# Altium footprint library Connectors.PcbLib: 67 footprints (part 2 of 5)
Each footprint in its own frame and in the unit in brackets; x right, y up, seen from the top. Pads: shape width x height; smd on the part's side, far side on the other; paste and mask are expansions set on the pad; w line width, h text height; cw(c..) or ccw(c..) is an arc to the next point about the centre after c.
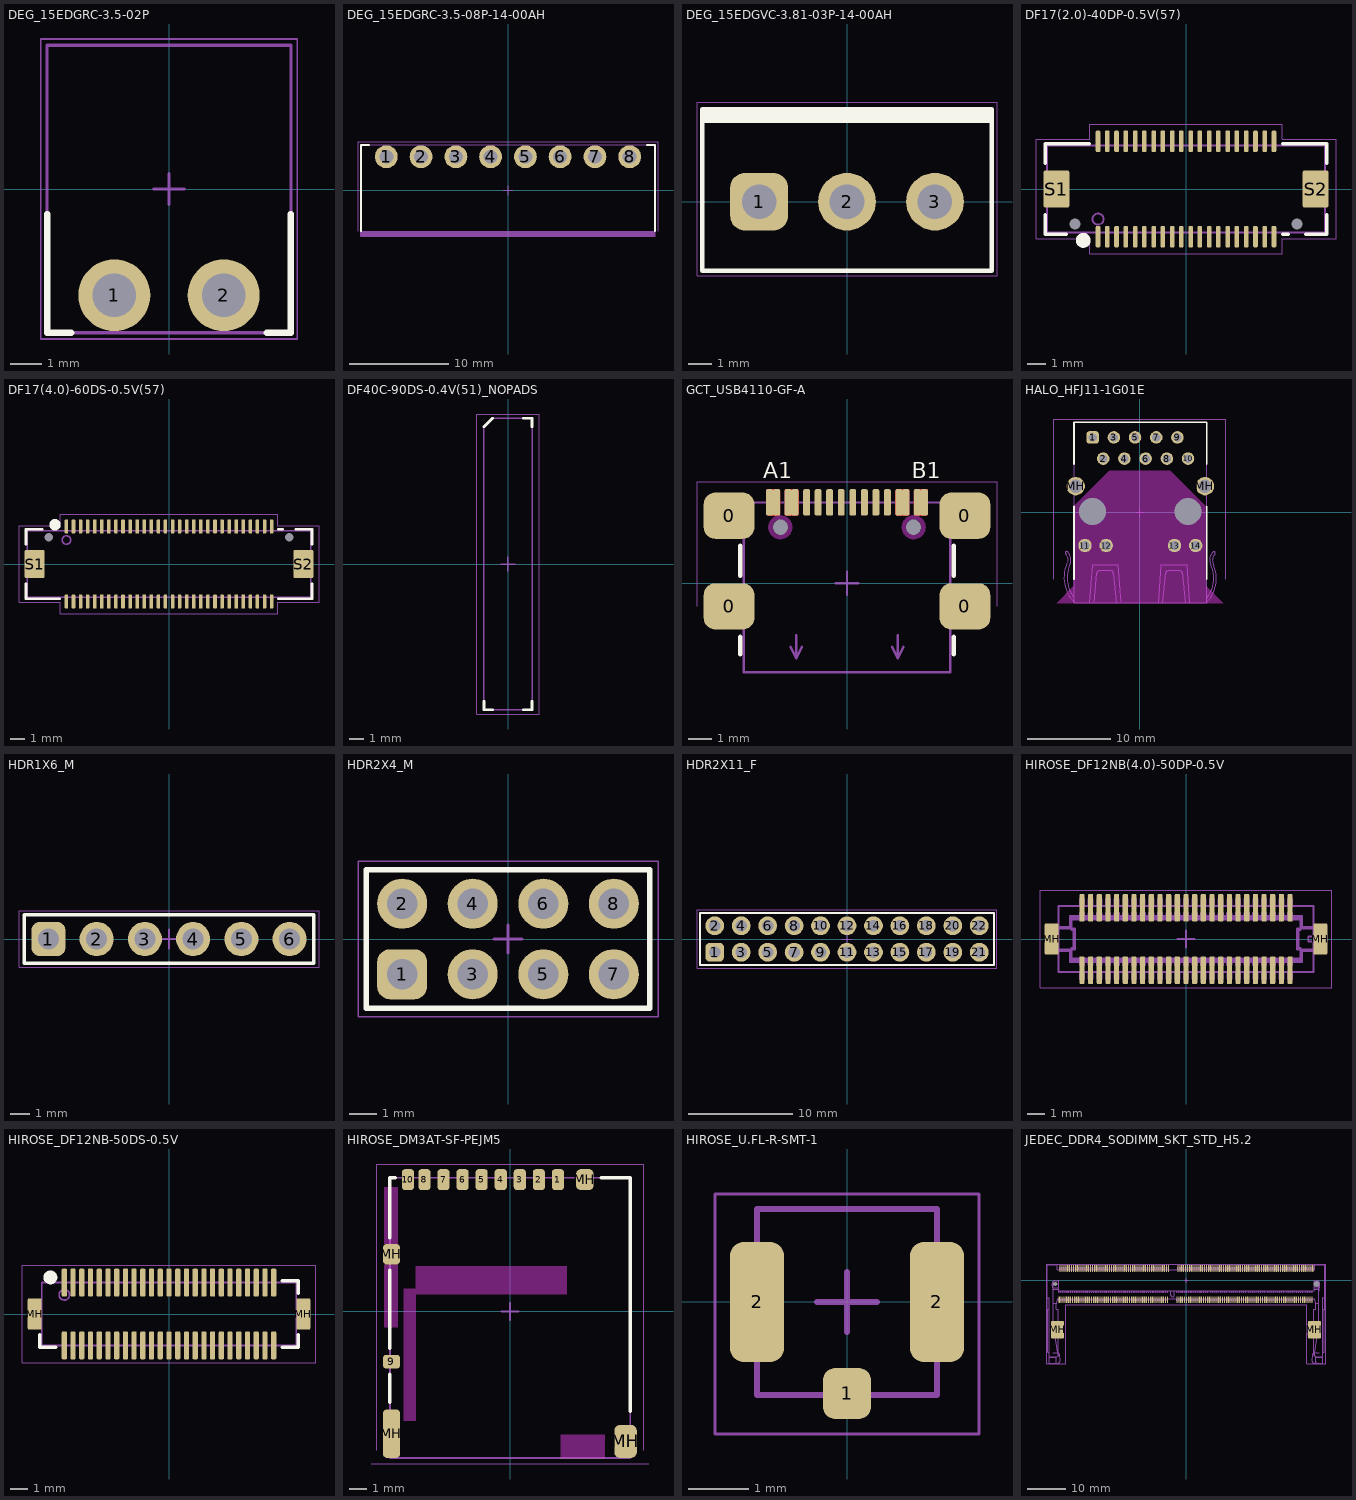
[diagram p1: the footprints below, top view; thin cyan lines are the x and y axes]

## DEG_15EDGRC-3.5-02P [mm]
pads (2):
  round 2.3 hole 1.4 mask+0.05: 1(-1.75,-3.4) 2(1.75,-3.4)
Top Overlay:
  lines w0.2: -3.9,-0.8 -3.9,-4.6 ; -3.125,-4.6 -3.9,-4.6 ; 3.125,-4.6 3.9,-4.6 ; 3.9,-0.8 3.9,-4.6 ; -3.9,-4.6 -3.9,-4.6 ; 3.9,-4.6 3.9,-4.6
Top Assembly:
  lines w0.1: -3.9,-4.6 3.9,-4.6 3.9,4.6 -3.9,4.6 -3.9,-4.6
  text ".Designator" at -5.835,-0.571 h1.6
Top Courtyard (Mech13):
  lines w0.05: -4.1,-4.8 -4.1,4.8 4.1,4.8 4.1,-4.8 -4.1,-4.8
  lines w0.1: -0.5,0 0.5,0 ; 0,-0.5 0,0.5
3D body "User Library-15EDGRC-3_5-2.STEP": height 7.2, standoff -3.4, extent -3.9,-4.6 3.9,4.6

## DEG_15EDGRC-3.5-08P-14-00AH [mm]
pads (8):
  round 2.3 hole 1.4 mask+0.05: 1(-12.25,3.4) 2(-8.75,3.4) 3(-5.25,3.4) 4(-1.75,3.4) 5(1.75,3.4) 6(5.25,3.4) 7(8.75,3.4) 8(12.25,3.4)
Top Overlay:
  lines w0.2: -14.8,-4.1 -14.8,4.6 -14,4.6 ; 14,4.6 14.8,4.6 14.8,-4.1
Top Assembly:
  region: -14.8,-4.1 -14.8,-4.6 14.8,-4.6 14.8,-4.1
  lines w0.1: -14.8,-4.1 14.8,-4.1 ; -14.8,-4.6 14.8,-4.6 14.8,4.6 -14.8,4.6 -14.8,-4.6
  text ".Designator" at -5.835,-0.571 h1.6
Top Courtyard (Mech13):
  lines w0.05: -15.1,-4.1 -15.1,4.9 15.1,4.9 15.1,-4.1
  lines w0.1: -0.5,0 0.5,0 ; 0,-0.5 0,0.5
3D body "15EDGRC-3_5-08P.x_t": height 7.2, standoff -3.4, extent -14.8,-4.6 14.8,4.6

## DEG_15EDGVC-3.81-03P-14-00AH [mm]
pads (3):
  rrect50% 2.5x2.5 hole 1.5: 1(-3.81,0)
  round 2.5 hole 1.5: 2(0,0) 3(3.81,0)
Top Overlay:
  region: -6.275,4 -6.275,3.5 6.275,3.5 6.275,4
  lines w0.2: -6.275,4 6.275,4 ; -6.275,4 -6.275,-3 6.275,-3 6.275,4 ; -6.275,4 -6.275,3.5 6.275,3.5 6.275,4
Top Assembly:
  region: -6.275,4 -6.275,3.5 6.275,3.5 6.275,4
  lines w0.1: -6.275,4 -6.275,-3 6.275,-3 6.275,4 ; -6.275,4 6.275,4 ; -6.275,4 -6.275,3.5 6.275,3.5 6.275,4
  text ".Designator" at -5.835,-0.571 h1.6
Top Courtyard (Mech13):
  lines w0.05: -6.5,-3.2 -6.5,4.3 6.5,4.3 6.5,-3.2 -6.5,-3.2
  lines w0.1: -0.5,0 0.5,0 ; 0,-0.5 0,0.5
3D body "User Library-Terminal Block Header - 3 Pin - ED2820-ND.x_t": height 9.2, standoff -3.5, extent -6.26,-3 6.26,4

## DF17(2.0)-40DP-0.5V(57) [mm]
height 4.3
pads (44):
  rrect50% 0.25x1.15 smd mask+0.05: 1(-4.75,-2.575) 2(-4.75,2.575) 3(-4.25,-2.575) 4(-4.25,2.575) 5(-3.75,-2.575) 6(-3.75,2.575) 7(-3.25,-2.575) 8(-3.25,2.575) 9(-2.75,-2.575) 10(-2.75,2.575) 11(-2.25,-2.575) 12(-2.25,2.575) 13(-1.75,-2.575) 14(-1.75,2.575) 15(-1.25,-2.575) 16(-1.25,2.575) 17(-0.75,-2.575) 18(-0.75,2.575) 19(-0.25,-2.575) 20(-0.25,2.575) 21(0.25,-2.575) 22(0.25,2.575) 23(0.75,-2.575) 24(0.75,2.575) 25(1.25,-2.575) 26(1.25,2.575) 27(1.75,-2.575) 28(1.75,2.575) 29(2.25,-2.575) 30(2.25,2.575) 31(2.75,-2.575) 32(2.75,2.575) 33(3.25,-2.575) 34(3.25,2.575) 35(3.75,-2.575) 36(3.75,2.575) 37(4.25,-2.575) 38(4.25,2.575) 39(4.75,-2.575) 40(4.75,2.575)
  round 0 hole 0.6 unplated mask+0.1: MH(-6,-1.9) MH(6,-1.9)
  rrect15% 1.4x2 smd: S1(-7,0) S2(7,0)
Top Overlay:
  circle w0.4: c-5.55,-2.775 r0.2
  lines w0.2: -7.6,-1.4 -7.6,-2.45 -6.475,-2.45 ; -7.6,1.4 -7.6,2.45 -5.225,2.45 ; 5.225,-2.45 5.525,-2.45 ; 5.225,2.45 7.6,2.45 7.6,1.4 ; 6.475,-2.45 7.6,-2.45 7.6,-1.4
Top Assembly:
  circle w0.1: c-4.75,-1.625 r0.3
  lines w0.1: -7.5,-2.35 -7.5,2.35 7.5,2.35 7.5,-2.35 -7.5,-2.35
  text ".Designator" at -5.835,-0.571 h1.6
Top Courtyard (Mech13):
  lines w0.05: -8.1,-2.7 -5.2,-2.7 -5.2,-3.5 5.2,-3.5 5.2,-2.7 8.1,-2.7 8.1,2.7 5.2,2.7 5.2,3.5 -5.2,3.5 -5.2,2.7 -8.1,2.7 -8.1,-2.7
3D body "DF17(2.0)-40DP-0.5V(57)--3DModel-STEP-56544.STEP": height 4.3, standoff -0.7, extent -7.5,-2.85 7.5,2.85

## DF17(4.0)-60DS-0.5V(57) [mm]
height 4.5
pads (64):
  rrect50% 0.25x1 smd mask+0.05: 1(-7.25,2.65) 2(-7.25,-2.65) 3(-6.75,2.65) 4(-6.75,-2.65) 5(-6.25,2.65) 6(-6.25,-2.65) 7(-5.75,2.65) 8(-5.75,-2.65) 9(-5.25,2.65) 10(-5.25,-2.65) 11(-4.75,2.65) 12(-4.75,-2.65) 13(-4.25,2.65) 14(-4.25,-2.65) 15(-3.75,2.65) 16(-3.75,-2.65) 17(-3.25,2.65) 18(-3.25,-2.65) 19(-2.75,2.65) 20(-2.75,-2.65) 21(-2.25,2.65) 22(-2.25,-2.65) 23(-1.75,2.65) 24(-1.75,-2.65) 25(-1.25,2.65) 26(-1.25,-2.65) 27(-0.75,2.65) 28(-0.75,-2.65) 29(-0.25,2.65) 30(-0.25,-2.65) 31(0.25,2.65) 32(0.25,-2.65) 33(0.75,2.65) 34(0.75,-2.65) 35(1.25,2.65) 36(1.25,-2.65) 37(1.75,2.65) 38(1.75,-2.65) 39(2.25,2.65) 40(2.25,-2.65)
  rrect50% 0.25x1 smd paste+0 mask+0.05: 41(2.75,2.65) 42(2.75,-2.65) 43(3.25,2.65) 44(3.25,-2.65) 45(3.75,2.65) 46(3.75,-2.65) 47(4.25,2.65) 48(4.25,-2.65) 49(4.75,2.65) 50(4.75,-2.65) 51(5.25,2.65) 52(5.25,-2.65) 53(5.75,2.65) 54(5.75,-2.65) 55(6.25,2.65) 56(6.25,-2.65) 57(6.75,2.65) 58(6.75,-2.65) 59(7.25,2.65) 60(7.25,-2.65)
  round 0 hole 0.6 unplated mask+0.1: MH(-8.5,1.9) MH(8.5,1.9)
  rrect15% 1.4x2 smd: S1(-9.5,0) S2(9.5,0)
Top Overlay:
  circle w0.4: c-8.05,2.775 r0.2
  lines w0.2: -10.1,-1.4 -10.1,-2.45 -7.725,-2.45 ; -10.1,1.4 -10.1,2.45 -8.975,2.45 ; 7.725,-2.45 10.1,-2.45 10.1,-1.4 ; 7.725,2.45 8.025,2.45 ; 8.975,2.45 10.1,2.45 10.1,1.4
Top Assembly:
  circle w0.1: c-7.25,1.7 r0.3
  lines w0.1: -10,-2.35 10,-2.35 10,2.35 -10,2.35 -10,-2.35
  text ".Designator" at -5.835,-0.571 h1.6
Top Courtyard (Mech13):
  lines w0.05: -10.6,-2.7 -7.7,-2.7 -7.7,-3.5 7.7,-3.5 7.7,-2.7 10.6,-2.7 10.6,2.7 7.7,2.7 7.7,3.5 -7.7,3.5 -7.7,2.7 -10.6,2.7 -10.6,-2.7
3D body "DF17(4_0)-60DS-0_5V.stp": height 4.5, standoff -0.6, extent -10,-2.85 10,2.85

## DF40C-90DS-0.4V(51)_NOPADS [mm]
Top Overlay:
  lines w0.2: -1.69,-9.7 -1.69,-10.3 -1.09,-10.3 ; -1.69,9.702 -1.1,10.3 ; 1.09,-10.3 1.69,-10.3 1.69,-9.7 ; 1.09,10.302 1.69,10.302 1.69,9.702
Top Assembly:
  lines w0.1: -1.7,-10.3 -1.7,9.7 -1.1,10.3 1.7,10.3 1.7,-10.3 -1.7,-10.3
  text ".Designator" at 0.571,-5.835 h1.6
Top Courtyard (Mech13):
  lines w0.05: -2.2,-10.6 2.2,-10.6 2.2,10.6 -2.2,10.6 -2.2,-10.6
  lines w0.1: -0.5,0 0.5,0 ; 0,-0.5 0,0.5
3D body "DF40C-90DS.stp": height 1.44, standoff -0.01, extent -1.69,-10.3 1.69,10.3

## GCT_USB4110-GF-A [mm]
height 3.26
pads (22):
  rrect50% 2.2x2 smd paste+0 mask+0.05: 0(-5.11,-1) 0(-5.11,2.93) 0(5.11,-1) 0(5.11,2.93)
  rrect50% 0.3x1.15 smd paste-1 mask+0.05: A1(-3.35,3.505) A4(-2.55,3.505) A9(2.55,3.505) A12(3.35,3.505) B1(3.05,3.505) B4(2.25,3.505) B9(-2.25,3.505) B12(-3.05,3.505)
  rrect50% 0.3x1.15 smd paste+0 mask+0.05: A5(-1.25,3.505) A6(-0.25,3.505) A7(0.25,3.505) A8(1.25,3.505) B5(1.75,3.505) B6(0.75,3.505) B7(-0.75,3.505) B8(-1.75,3.505)
  round 0 hole 0.65 unplated paste+0 mask+0.05: MH(-2.89,2.43) MH(2.89,2.43)
Top Layer:
  region: 2.975,4.08 2.96,4.08 2.933,4.069 2.911,4.047 2.9,4.02 2.9,4.005 2.9,3.005 2.9,2.99 2.911,2.963 2.933,2.941 2.96,2.93 2.975,2.93 3.425,2.93 3.44,2.93 3.467,2.941 3.489,2.963 3.5,2.99 3.5,3.005 3.5,4.005 3.5,4.02 3.489,4.047 3.467,4.069 3.44,4.08 3.425,4.08
  region: 2.175,4.08 2.16,4.08 2.133,4.069 2.111,4.047 2.1,4.02 2.1,4.005 2.1,3.005 2.1,2.99 2.111,2.963 2.133,2.941 2.16,2.93 2.175,2.93 2.625,2.93 2.64,2.93 2.667,2.941 2.689,2.963 2.7,2.99 2.7,3.005 2.7,4.005 2.7,4.02 2.689,4.047 2.667,4.069 2.64,4.08 2.625,4.08
  region: -2.625,4.08 -2.64,4.08 -2.667,4.069 -2.689,4.047 -2.7,4.02 -2.7,4.005 -2.7,3.005 -2.7,2.99 -2.689,2.963 -2.667,2.941 -2.64,2.93 -2.625,2.93 -2.175,2.93 -2.16,2.93 -2.133,2.941 -2.111,2.963 -2.1,2.99 -2.1,3.005 -2.1,4.005 -2.1,4.02 -2.111,4.047 -2.133,4.069 -2.16,4.08 -2.175,4.08
  region: -3.425,4.08 -3.44,4.08 -3.467,4.069 -3.489,4.047 -3.5,4.02 -3.5,4.005 -3.5,3.005 -3.5,2.99 -3.489,2.963 -3.467,2.941 -3.44,2.93 -3.425,2.93 -2.975,2.93 -2.96,2.93 -2.933,2.941 -2.911,2.963 -2.9,2.99 -2.9,3.005 -2.9,4.005 -2.9,4.02 -2.911,4.047 -2.933,4.069 -2.96,4.08 -2.975,4.08
Top Overlay:
  lines w0.2: -4.625,-3.075 -4.625,-2.325 ; -4.625,0.325 -4.625,1.625 ; 4.625,-3.075 4.625,-2.325 ; 4.625,0.325 4.625,1.625
  text "B1" at 2.8,4.325 h1.2
  text "A1" at -3.625,4.325 h1.2
Keep-Out Layer:
  circle w0.2: c-2.89,2.43 r0.425
  circle w0.2: c2.89,2.43 r0.425
Top Assembly:
  lines w0.1: -4.47,-1.5 -5.65,-1.5 -5.65,-0.5 -4.47,-0.5 ; -4.47,2.43 -5.65,2.43 -5.65,3.43 -4.47,3.43 ; -2.45,-2.75 -2.2,-3.25 ; -2.2,-2.25 -2.2,-3.25 ; -1.95,-2.75 -2.2,-3.25 ; 1.95,-2.75 2.2,-3.25 ; 2.2,-2.25 2.2,-3.25 ; 2.45,-2.75 2.2,-3.25 ; 4.47,-1.5 5.65,-1.5 5.65,-0.5 4.47,-0.5 ; 4.47,2.43 5.65,2.43 5.65,3.43 4.47,3.43 ; -4.47,-3.85 -4.47,3.5 4.47,3.5 4.47,-3.85 -4.47,-3.85
  text "B1" at -1.053,-0.95 h1.6
  text "A1" at -1.136,-0.95 h1.6
  text ".Designator" at -5.835,-0.571 h1.6
Top Courtyard (Mech13):
  lines w0.05: -6.5,-1 -6.5,4.4 6.5,4.4 6.5,-1
  lines w0.1: -0.5,0 0.5,0 ; 0,-0.5 0,0.5
3D body "USB4110-GF-A.stp": height 3.26, standoff -0.63, extent -5.65,-3.85 5.65,3.85

## HALO_HFJ11-1G01E [mm] "Gifabit FastJack RG-45connector with magnetic Standart Choke"
height 13.64
pads (18):
  round 0 hole 3.25 unplated mask+0.1: 0(-5.668,0.101) 0(5.762,0.101)
  rrect50% 1.5x1.5 hole 1 mask+0.05: 1(-5.668,8.991)
  round 1.5 hole 1 mask+0.05: 2(-4.398,6.451) 3(-3.128,8.991) 4(-1.858,6.451) 5(-0.588,8.991) 6(0.682,6.451) 7(1.952,8.991) 8(3.222,6.451) 9(4.492,8.991) 10(5.762,6.451)
  round 1.6 hole 1.1 mask+0.05: 11(-6.583,-3.959) 12(-4.043,-3.959) 13(4.137,-3.959) 14(6.677,-3.959)
  round 2.2 hole 1.6 mask+0.05: MH(-7.698,3.151) MH(7.792,3.151)
Top Overlay:
  lines w0.2: -7.9,-8 -7.9,0.75 ; -7.9,5.8 -7.9,10.8 7.994,10.8 7.994,5.8 ; 7.994,-8 7.994,0.75
Keep-Out Layer:
  region: -9.993,-10.895 -7.9,-8.802 -7.9,0.75 -3.65,5 0,5 0,-10.895
  region: 9.993,-10.895 7.9,-8.802 7.9,0.75 3.65,5 0,5 0,-10.895
Top Assembly:
  lines w0.1: -8.76,-6.228 ccw(c-9.581,-5.661) -8.635,-5.978 ccw(c-9.543,-5.674) -8.885,-4.978 ; -8.76,-6.228 ccw(c-7.939,-6.795) -8.885,-6.478 ccw(c-4.952,-7.795) -7.885,-10.728 ; -7.885,-10.228 cw(c-4.857,-7.818) -8.385,-6.228 ccw(c-9.634,-5.665) -8.635,-4.728 ; -6.019,-10.791 -5.668,-6.259 -2.668,-6.259 -2.319,-10.791 ; -5.489,-10.792 -5.168,-7.259 cw(c-4.893,-7.284) -4.918,-7.009 cw(c-4.168,-15.259) -3.418,-7.009 cw(c-3.443,-7.284) -3.168,-7.259 -2.847,-10.792 ; 2.231,-10.791 2.582,-6.259 5.582,-6.259 5.931,-10.791 ; 2.761,-10.792 3.082,-7.259 cw(c3.357,-7.284) 3.332,-7.009 cw(c4.082,-15.259) 4.832,-7.009 cw(c4.807,-7.284) 5.082,-7.259 5.403,-10.792 ; 7.982,-10.759 ccw(c5.149,-7.926) 8.982,-6.759 ; 7.982,-10.259 ccw(c5.176,-7.877) 8.482,-6.259 cw(c9.657,-5.684) 8.732,-4.759 ; 8.982,-6.759 ccw(c1.766,-8.955) 8.857,-6.384 cw(c15.948,-3.812) 8.732,-6.009 cw(c9.69,-5.717) 8.982,-5.009 ; -8.885,-4.978 cw(c-8.765,-4.848) -8.635,-4.728 ; -8.885,-4.978 cw(c-8.765,-4.848) -8.635,-4.728 ; 8.732,-4.759 cw(c8.857,-4.884) 8.982,-5.009 ; 8.732,-4.759 cw(c8.857,-4.884) 8.982,-5.009 ; -7.893,-10.799 -7.893,10.791 7.987,10.791 7.987,-10.799 -7.893,-10.799
  text ".Designator" at -5.835,-0.571 h1.6
Top Courtyard (Mech13):
  lines w0.05: -10.3,-8 -10.3,11.2 10.3,11.2 10.3,-8
  lines w0.1: -0.5,0 0.5,0 ; 0,-0.5 0,0.5
3D body "User Library-HFJ11-1G01ER.STEP": height 15.62, standoff -3.08, extent -9.993,-10.894 9.993,10.896

## HDR1X6_M [mm]
pads (6):
  rrect50% 1.8x1.8 hole 1.1 mask+0.05: 1(-6.35,0)
  round 1.8 hole 1.1 mask+0.05: 2(-3.81,0) 3(-1.27,0) 4(1.27,0) 5(3.81,0) 6(6.35,0)
Top Overlay:
  lines w0.2: -7.625,-1.275 7.625,-1.275 7.625,1.275 -7.625,1.275 -7.625,-1.275
Top Assembly:
  lines w0.1: -7.625,-1.275 -7.625,1.275 7.625,1.275 7.625,-1.275 -7.625,-1.275
  text ".Designator" at -5.835,-0.571 h1.6
Top Courtyard (Mech13):
  lines w0.05: -7.9,-1.5 7.9,-1.5 7.9,1.5 -7.9,1.5 -7.9,-1.5
  lines w0.1: -0.5,0 0.5,0 ; 0,-0.5 0,0.5
3D body "User Library-1x6 TH Pitch 2_54mm.X_T": height 9.2, standoff -3.5, extent -7.62,-1.27 7.62,1.27

## HDR2X4_M [mm]
pads (8):
  rrect50% 1.8x1.8 hole 1.1 mask+0.05: 1(-3.81,-1.27)
  round 1.8 hole 1.1 mask+0.05: 2(-3.81,1.27) 3(-1.27,-1.27) 4(-1.27,1.27) 5(1.27,-1.27)
  round 1.8 hole 1.1: 6(1.27,1.27) 7(3.81,-1.27) 8(3.81,1.27)
Top Overlay:
  lines w0.2: -5.1,-2.5 -5.1,2.5 5.1,2.5 5.1,-2.5 -5.1,-2.5
Top Assembly:
  lines w0.1: -5.1,-2.5 5.1,-2.5 5.1,2.5 -5.1,2.5 -5.1,-2.5
  text ".Designator" at -5.835,-0.571 h1.6
Top Courtyard (Mech13):
  lines w0.05: -5.4,-2.8 -5.4,2.8 5.4,2.8 5.4,-2.8 -5.4,-2.8
  lines w0.1: -0.5,0 0.5,0 ; 0,-0.5 0,0.5
3D body "header.stp": height 8.54, standoff -3, extent -5.08,-2.49 5.08,2.49

## HDR2X11_F [mm]
pads (22):
  rrect50% 1.8x1.8 hole 1.1 mask+0.05: 1(-12.7,-1.27)
  round 1.8 hole 1.1 mask+0.05: 2(-12.7,1.27) 3(-10.16,-1.27) 4(-10.16,1.27) 5(-7.62,-1.27) 6(-7.62,1.27) 7(-5.08,-1.27) 8(-5.08,1.27) 9(-2.54,-1.27) 10(-2.54,1.27) 11(0,-1.27) 12(0,1.27) 13(2.54,-1.27) 14(2.54,1.27) 15(5.08,-1.27) 16(5.08,1.27) 17(7.62,-1.27) 18(7.62,1.27) 19(10.16,-1.27) 20(10.16,1.27) 21(12.7,-1.27) 22(12.7,1.27)
Top Overlay:
  lines w0.2: -14.125,-2.5 14.125,-2.5 14.125,2.5 -14.125,2.5 -14.125,-2.5
Top Assembly:
  lines w0.1: -14.125,-2.5 -14.125,2.5 14.125,2.5 14.125,-2.5 -14.125,-2.5
  text ".Designator" at -5.835,-0.571 h1.6
Top Courtyard (Mech13):
  lines w0.05: -14.4,-2.8 14.4,-2.8 14.4,2.8 -14.4,2.8 -14.4,-2.8
  lines w0.1: -0.5,0 0.5,0 ; 0,-0.5 0,0.5
3D body "User Library-Header 2x1 2_54mm.x_t": height 8.5, standoff -2.6, extent 11.28,-2.5 14.12,2.5
3D body "User Library-Header 2x1 2_54mm.x_t": height 8.5, standoff -2.6, extent 8.74,-2.5 11.58,2.5
3D body "User Library-Header 2x1 2_54mm.x_t": height 8.5, standoff -2.6, extent 6.2,-2.5 9.04,2.5
3D body "User Library-Header 2x1 2_54mm.x_t": height 8.5, standoff -2.6, extent 3.66,-2.5 6.5,2.5
3D body "User Library-Header 2x1 2_54mm.x_t": height 8.5, standoff -2.6, extent 1.12,-2.5 3.96,2.5
3D body "User Library-Header 2x1 2_54mm.x_t": height 8.5, standoff -2.6, extent -1.42,-2.5 1.42,2.5
3D body "User Library-Header 2x1 2_54mm.x_t": height 8.5, standoff -2.6, extent -3.96,-2.5 -1.12,2.5
3D body "User Library-Header 2x1 2_54mm.x_t": height 8.5, standoff -2.6, extent -6.5,-2.5 -3.66,2.5
3D body "User Library-Header 2x1 2_54mm.x_t": height 8.5, standoff -2.6, extent -9.04,-2.5 -6.2,2.5
3D body "User Library-Header 2x1 2_54mm.x_t": height 8.5, standoff -2.6, extent -11.58,-2.5 -8.74,2.5
3D body "User Library-Header 2x1 2_54mm.x_t": height 8.5, standoff -2.6, extent -14.12,-2.5 -11.28,2.5

## HIROSE_DF12NB(4.0)-50DP-0.5V [mm]
pads (52):
  rrect50% 0.3x1.6 smd mask+0.05: 1(-6,-1.8) 2(-6,1.8) 3(-5.5,-1.8) 4(-5.5,1.8) 5(-5,-1.8) 6(-5,1.8) 7(-4.5,-1.8) 8(-4.5,1.8) 9(-4,-1.8) 10(-4,1.8) 11(-3.5,-1.8) 12(-3.5,1.8) 13(-3,-1.8) 14(-3,1.8) 15(-2.5,-1.8) 16(-2.5,1.8) 17(-2,-1.8) 18(-2,1.8) 19(-1.5,-1.8) 20(-1.5,1.8) 21(-1,-1.8) 22(-1,1.8) 23(-0.5,-1.8) 24(-0.5,1.8) 25(0,-1.8) 26(0,1.8) 27(0.5,-1.8) 28(0.5,1.8) 29(1,-1.8) 30(1,1.8) 31(1.5,-1.8) 32(1.5,1.8) 33(2,-1.8) 34(2,1.8) 35(2.5,-1.8) 36(2.5,1.8) 37(3,-1.8) 38(3,1.8) 39(3.5,-1.8) 40(3.5,1.8) 41(4,-1.8) 42(4,1.8) 43(4.5,-1.8) 44(4.5,1.8) 45(5,-1.8) 46(5,1.8) 47(5.5,-1.8) 48(5.5,1.8) 49(6,-1.8) 50(6,1.8)
  rrect20% 0.8x1.8 smd mask+0.05: MH(-7.75,0) MH(7.75,0)
Top Assembly:
  drawing of 995 lines, arcs and shapes, not listed
  text ".Designator" at -5.835,-0.571 h1.6
Top Courtyard (Mech13):
  lines w0.05: -8.4,-2.8 8.4,-2.8 8.4,2.8 -8.4,2.8 -8.4,-2.8
  lines w0.1: -0.5,0 0.5,0 ; 0,-0.5 0,0.5
3D body "DF12NB(4.0)-50DP.stp": height 3.3, standoff 0, extent -7.8,-2.3 7.8,2.3

## HIROSE_DF12NB-50DS-0.5V [mm]
pads (52):
  rrect50% 0.3x1.6 smd mask+0.05: 1(-6,1.8) 2(-6,-1.8) 3(-5.5,1.8) 4(-5.5,-1.8) 5(-5,1.8) 6(-5,-1.8) 7(-4.5,1.8) 8(-4.5,-1.8) 9(-4,1.8) 10(-4,-1.8) 11(-3.5,1.8) 12(-3.5,-1.8) 13(-3,1.8) 14(-3,-1.8) 15(-2.5,1.8) 16(-2.5,-1.8) 17(-2,1.8) 18(-2,-1.8) 19(-1.5,1.8) 20(-1.5,-1.8) 21(-1,1.8) 22(-1,-1.8) 23(-0.5,1.8) 24(-0.5,-1.8) 25(0,1.8) 26(0,-1.8) 27(0.5,1.8) 28(0.5,-1.8) 29(1,1.8) 30(1,-1.8) 31(1.5,1.8) 32(1.5,-1.8) 33(2,1.8) 34(2,-1.8) 35(2.5,1.8) 36(2.5,-1.8) 37(3,1.8) 38(3,-1.8) 39(3.5,1.8) 40(3.5,-1.8) 41(4,1.8) 42(4,-1.8) 43(4.5,1.8) 44(4.5,-1.8) 45(5,1.8) 46(5,-1.8) 47(5.5,1.8) 48(5.5,-1.8) 49(6,1.8) 50(6,-1.8)
  rrect20% 0.8x1.8 smd mask+0.05: MH(-7.7,0) MH(7.7,0)
Top Overlay:
  circle w0.4: c-6.8,2.1 r0.2
  lines w0.2: -7.4,-1.2 -7.4,-1.9 -6.5,-1.9 ; 6.5,-1.9 7.4,-1.9 7.4,-1.2 ; 6.5,1.9 7.4,1.9 7.4,1.2
Top Assembly:
  circle w0.1: c-6,1.1 r0.3
  lines w0.1: -7.3,-1.8 -7.3,1.8 7.3,1.8 7.3,-1.8 -7.3,-1.8
  text ".Designator" at -5.835,-0.571 h1.6
Top Courtyard (Mech13):
  lines w0.05: -8.4,-2.8 -8.4,2.8 8.4,2.8 8.4,-2.8 -8.4,-2.8
3D body "DF12NB-50DS-0.5V.stp": height 2.7, standoff 0, extent -7.8,-2.3 7.8,2.3

## HIROSE_DM3AT-SF-PEJM5 [mm]
height 1.7
pads (14):
  rrect50% 0.7x1.2 smd mask+0.05: 1(2.762,7.6) 2(1.662,7.6) 3(0.562,7.6) 4(-0.538,7.6) 5(-1.638,7.6) 6(-2.738,7.6) 7(-3.838,7.6) 8(-4.938,7.6) 10(-5.888,7.6)
  rrect50% 1x0.8 smd mask+0.05: 9(-6.838,-2.9)
  rrect50% 1x2.8 smd mask+0.05: MH(-6.838,-7.05)
  rrect50% 1x1.2 smd mask+0.05: MH(-6.838,3.3) MH(4.312,7.6)
  rrect50% 1.3x1.9 smd mask+0.05: MH(6.662,-7.5)
Top Layer keep-out:
  region: 5.462,-8.457 2.913,-8.457 2.913,-7.1 5.462,-7.1
  region: -6.488,3.893 -7.251,3.893 -7.251,7.15 -6.488,7.15
  region: -6.488,-0.905 -7.242,-0.905 -7.242,2.7 -6.488,2.7
  region: -5.438,-6.315 -6.144,-6.315 -6.144,1.3 -5.438,1.3
  region: 3.262,0.996 -5.441,0.996 -5.441,2.6 3.262,2.6
Top Overlay:
  lines w0.2: -6.925,-5.25 -6.925,-3.625 ; -6.925,-2.125 -6.925,2.375 ; -6.925,4.25 -6.925,7.7 -6.625,7.7 ; 5.25,7.7 6.925,7.7 6.925,-5.75
Board:
  lines w0.05: -8,-8.8 8,-8.8
Top Assembly:
  lines w0.1: -6.925,-8.45 6.925,-8.45 6.925,7.7 -6.925,7.7 -6.925,-8.45
  text ".Designator" at -5.835,-0.571 h1.6
Top Courtyard (Mech13):
  lines w0.05: -7.7,-8 -7.7,8.5 7.7,8.5 7.7,-8
  lines w0.1: -0.5,0 0.5,0 ; 0,-0.5 0,0.5
3D body "DM3AT-SF-PEJM5.stp": height 1.68, standoff 0, extent -6.925,-8.45 6.925,7.7

## HIROSE_U.FL-R-SMT-1 [mm]
height 0.35
pads (3):
  rrect50% 0.8x0.85 smd mask+0.05: 1(0,-1.525)
  rrect50% 0.9x2 smd mask+0.05: 2(-1.5,0) 2(1.5,0)
Top Assembly:
  lines w0.1: -1.5,-1.55 1.5,-1.55 1.5,1.55 -1.5,1.55 -1.5,-1.55
  text ".Designator" at -5.835,-0.571 h1.6
Top Courtyard (Mech13):
  lines w0.05: -2.2,-2.2 2.2,-2.2 2.2,1.8 -2.2,1.8 -2.2,-2.2
  lines w0.1: -0.5,0 0.5,0 ; 0,-0.5 0,0.5
3D body "User Library-U_FL-R-SMT-1.step": height 1.25, standoff -0.01, extent -1.5,-1.55 1.5,1.55

## JEDEC_DDR4_SODIMM_SKT_STD_H5.2 [mm]
pads (264):
  round 0 hole 1.1 unplated mask+0.1: 0(-34.525,-0.96)
  round 0 hole 1.6 unplated mask+0.1: 0(34.275,-0.96)
  rrect50% 0.3x1.75 smd mask+0.05: 1(33.25,3.14) 2(33,-5.06) 3(32.75,3.14) 4(32.5,-5.06) 5(32.25,3.14) 6(32,-5.06) 7(31.75,3.14) 8(31.5,-5.06) 9(31.25,3.14) 10(31,-5.06) 11(30.75,3.14) 12(30.5,-5.06) 13(30.25,3.14) 14(30,-5.06) 15(29.75,3.14) 16(29.5,-5.06) 17(29.25,3.14) 18(29,-5.06) 19(28.75,3.14) 20(28.5,-5.06) 21(28.25,3.14) 22(28,-5.06) 23(27.75,3.14) 24(27.5,-5.06) 25(27.25,3.14) 26(27,-5.06) 27(26.75,3.14) 28(26.5,-5.06) 29(26.25,3.14) 30(26,-5.06) 31(25.75,3.14) 32(25.5,-5.06) 33(25.25,3.14) 34(25,-5.06) 35(24.75,3.14) 36(24.5,-5.06) 37(24.25,3.14) 38(24,-5.06) 39(23.75,3.14) 40(23.5,-5.06) 41(23.25,3.14) 42(23,-5.06) 43(22.75,3.14) 44(22.5,-5.06) 45(22.25,3.14) 46(22,-5.06) 47(21.75,3.14) 48(21.5,-5.06) 49(21.25,3.14) 50(21,-5.06) 51(20.75,3.14) 52(20.5,-5.06) 53(20.25,3.14) 54(20,-5.06) 55(19.75,3.14) 56(19.5,-5.06) 57(19.25,3.14) 58(19,-5.06) 59(18.75,3.14) 60(18.5,-5.06) 61(18.25,3.14) 62(18,-5.06) 63(17.75,3.14) 64(17.5,-5.06) 65(17.25,3.14) 66(17,-5.06) 67(16.75,3.14) 68(16.5,-5.06) 69(16.25,3.14) 70(16,-5.06) 71(15.75,3.14) 72(15.5,-5.06) 73(15.25,3.14) 74(15,-5.06) 75(14.75,3.14) 76(14.5,-5.06) 77(14.25,3.14) 78(14,-5.06) 79(13.75,3.14) 80(13.5,-5.06) 81(13.25,3.14) 82(13,-5.06) 83(12.75,3.14) 84(12.5,-5.06) 85(12.25,3.14) 86(12,-5.06) 87(11.75,3.14) 88(11.5,-5.06) 89(11.25,3.14) 90(11,-5.06) 91(10.75,3.14) 92(10.5,-5.06) 93(10.25,3.14) 94(10,-5.06) 95(9.75,3.14) 96(9.5,-5.06) 97(9.25,3.14) 98(9,-5.06) 99(8.75,3.14) 100(8.5,-5.06) 101(8.25,3.14) 102(8,-5.06) 103(7.75,3.14) 104(7.5,-5.06) 105(7.25,3.14) 106(7,-5.06) 107(6.75,3.14) 108(6.5,-5.06) 109(6.25,3.14) 110(6,-5.06) 111(5.75,3.14) 112(5.5,-5.06) 113(5.25,3.14) 114(5,-5.06) 115(4.75,3.14) 116(4.5,-5.06) 117(4.25,3.14) 118(4,-5.06) 119(3.75,3.14) 120(3.5,-5.06) 121(3.25,3.14) 122(3,-5.06) 123(2.75,3.14) 124(2.5,-5.06) 125(2.25,3.14) 126(2,-5.06) 127(1.75,3.14) 128(1.5,-5.06) 129(1.25,3.14) 130(1,-5.06) 131(0.75,3.14) 132(0.5,-5.06) 133(0.25,3.14) 134(0,-5.06) 135(-0.25,3.14) 136(-0.5,-5.06) 137(-0.75,3.14) 138(-1,-5.06) 139(-1.25,3.14) 140(-1.5,-5.06) 141(-1.75,3.14) 142(-2,-5.06) 143(-2.25,3.14) 144(-2.5,-5.06) 145(-4.75,3.14) 146(-5,-5.06) 147(-5.25,3.14) 148(-5.5,-5.06) 149(-5.75,3.14) 150(-6,-5.06) 151(-6.25,3.14) 152(-6.5,-5.06) 153(-6.75,3.14) 154(-7,-5.06) 155(-7.25,3.14) 156(-7.5,-5.06) 157(-7.75,3.14) 158(-8,-5.06) 159(-8.25,3.14) 160(-8.5,-5.06) 161(-8.75,3.14) 162(-9,-5.06) 163(-9.25,3.14) 164(-9.5,-5.06) 165(-9.75,3.14) 166(-10,-5.06) 167(-10.25,3.14) 168(-10.5,-5.06) 169(-10.75,3.14) 170(-11,-5.06) 171(-11.25,3.14) 172(-11.5,-5.06) 173(-11.75,3.14) 174(-12,-5.06) 175(-12.25,3.14) 176(-12.5,-5.06) 177(-12.75,3.14) 178(-13,-5.06) 179(-13.25,3.14) 180(-13.5,-5.06) 181(-13.75,3.14) 182(-14,-5.06) 183(-14.25,3.14) 184(-14.5,-5.06) 185(-14.75,3.14) 186(-15,-5.06) 187(-15.25,3.14) 188(-15.5,-5.06) 189(-15.75,3.14) 190(-16,-5.06) 191(-16.25,3.14) 192(-16.5,-5.06) 193(-16.75,3.14) 194(-17,-5.06) 195(-17.25,3.14) 196(-17.5,-5.06) 197(-17.75,3.14) 198(-18,-5.06) 199(-18.25,3.14) 200(-18.5,-5.06) 201(-18.75,3.14) 202(-19,-5.06) 203(-19.25,3.14) 204(-19.5,-5.06) 205(-19.75,3.14) 206(-20,-5.06) 207(-20.25,3.14) 208(-20.5,-5.06) 209(-20.75,3.14) 210(-21,-5.06) 211(-21.25,3.14) 212(-21.5,-5.06) 213(-21.75,3.14) 214(-22,-5.06) 215(-22.25,3.14) 216(-22.5,-5.06) 217(-22.75,3.14) 218(-23,-5.06) 219(-23.25,3.14) 220(-23.5,-5.06) 221(-23.75,3.14) 222(-24,-5.06) 223(-24.25,3.14) 224(-24.5,-5.06) 225(-24.75,3.14) 226(-25,-5.06) 227(-25.25,3.14) 228(-25.5,-5.06) 229(-25.75,3.14) 230(-26,-5.06) 231(-26.25,3.14) 232(-26.5,-5.06) 233(-26.75,3.14) 234(-27,-5.06) 235(-27.25,3.14) 236(-27.5,-5.06) 237(-27.75,3.14) 238(-28,-5.06) 239(-28.25,3.14) 240(-28.5,-5.06) 241(-28.75,3.14) 242(-29,-5.06) 243(-29.25,3.14) 244(-29.5,-5.06) 245(-29.75,3.14) 246(-30,-5.06) 247(-30.25,3.14) 248(-30.5,-5.06) 249(-30.75,3.14) 250(-31,-5.06) 251(-31.25,3.14) 252(-31.5,-5.06) 253(-31.75,3.14) 254(-32,-5.06) 255(-32.25,3.14) 256(-32.5,-5.06) 257(-32.75,3.14) 258(-33,-5.06) 259(-33.25,3.14) 260(-33.5,-5.06)
  rrect20% 3.5x4.6 smd mask+0.05: MH(-33.925,-12.96) MH(33.675,-12.96)
Top Assembly:
  drawing of 2347 lines, arcs and shapes, not listed
  text ".Designator" at -5.835,-0.571 h1.6
Top Courtyard (Mech13):
  lines w0.05: -36.8,-22 -36.8,4.3 36.7,4.3 36.7,-22 31.7,-22 31.7,-6.4 -31.8,-6.4 -31.8,-22 -36.8,-22
  lines w0.1: -0.5,0 0.5,0 ; 0,-0.5 0,0.5
3D body "ttm_sodimm_skt.stp": height 5.15, standoff -0.4, extent -36.625,-21.775 36.375,4.075